# Altium integrated library Integrated_Library.IntLib: 173 symbols (part 2 of 2)
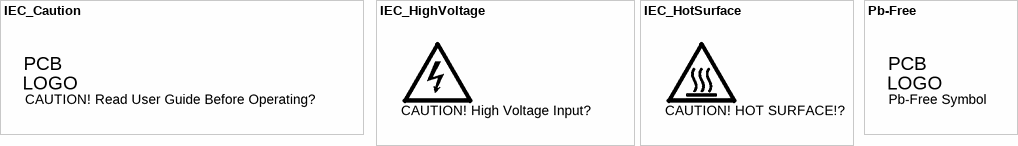
[diagram p21: symbols IEC_Caution to Pb-Free]

## IEC_HighVoltage
designator CAUTION! High Voltage Input?, comment DANGER HIGH VOLTAGE  (value not drawn)  (no BOM)
IEC 61010-1 High Voltage Warning; SymbolCreator: a0412235; SymbolVersion: 2011-08-22; Published: 2009-03-03; Publisher: Texas Instruments; LatestRevisionDate: 2016-02-04
footprint IEC_HighVoltage_Large
footprint IEC_HighVoltage_Medium
footprint IEC_HighVoltage_Small

## IEC_HotSurface
designator CAUTION! HOT SURFACE!?, comment CAUTION HOT SURFACE  (value not drawn)  (no BOM)
IEC 61010-1 Hot Surface Warning; SymbolCreator: a0412235; SymbolVersion: 2011-08-22; Published: 2009-03-03; Publisher: Texas Instruments; LatestRevisionDate: 2016-02-04
footprint IEC_HotSurface_Large
footprint IEC_HotSurface_Medium
footprint IEC_HotSurface_Small

## Pb-Free
designator Logo?, comment Pb-Free Symbol  (no BOM)
SymbolCreator: a0412235; SymbolVersion: 2011-08-22; Published: 2009-03-03; Publisher: Texas Instruments; LatestRevisionDate: 2014-08-05
footprint Pb-Free_Overlay_Medium
footprint Pb-Free_Overlay_Small
text: PCB; LOGO


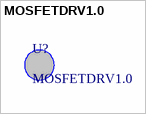
[diagram p20: symbol MOSFETDRV1.0]

## MOSFETDRV1.0
designator U?
WipowerOne Mosfet Driver
footprint MosfetDriver1.0 (WipowerOne Mosfet Driver)